# Altium footprint library Capacitors.PcbLib: 240 footprints (part 14 of 15)
Each footprint in its own frame and in the unit in brackets; x right, y up, seen from the top. Pads: shape width x height; smd on the part's side, far side on the other; paste and mask are expansions set on the pad; w line width, h text height; cw(c..) or ccw(c..) is an arc to the next point about the centre after c.
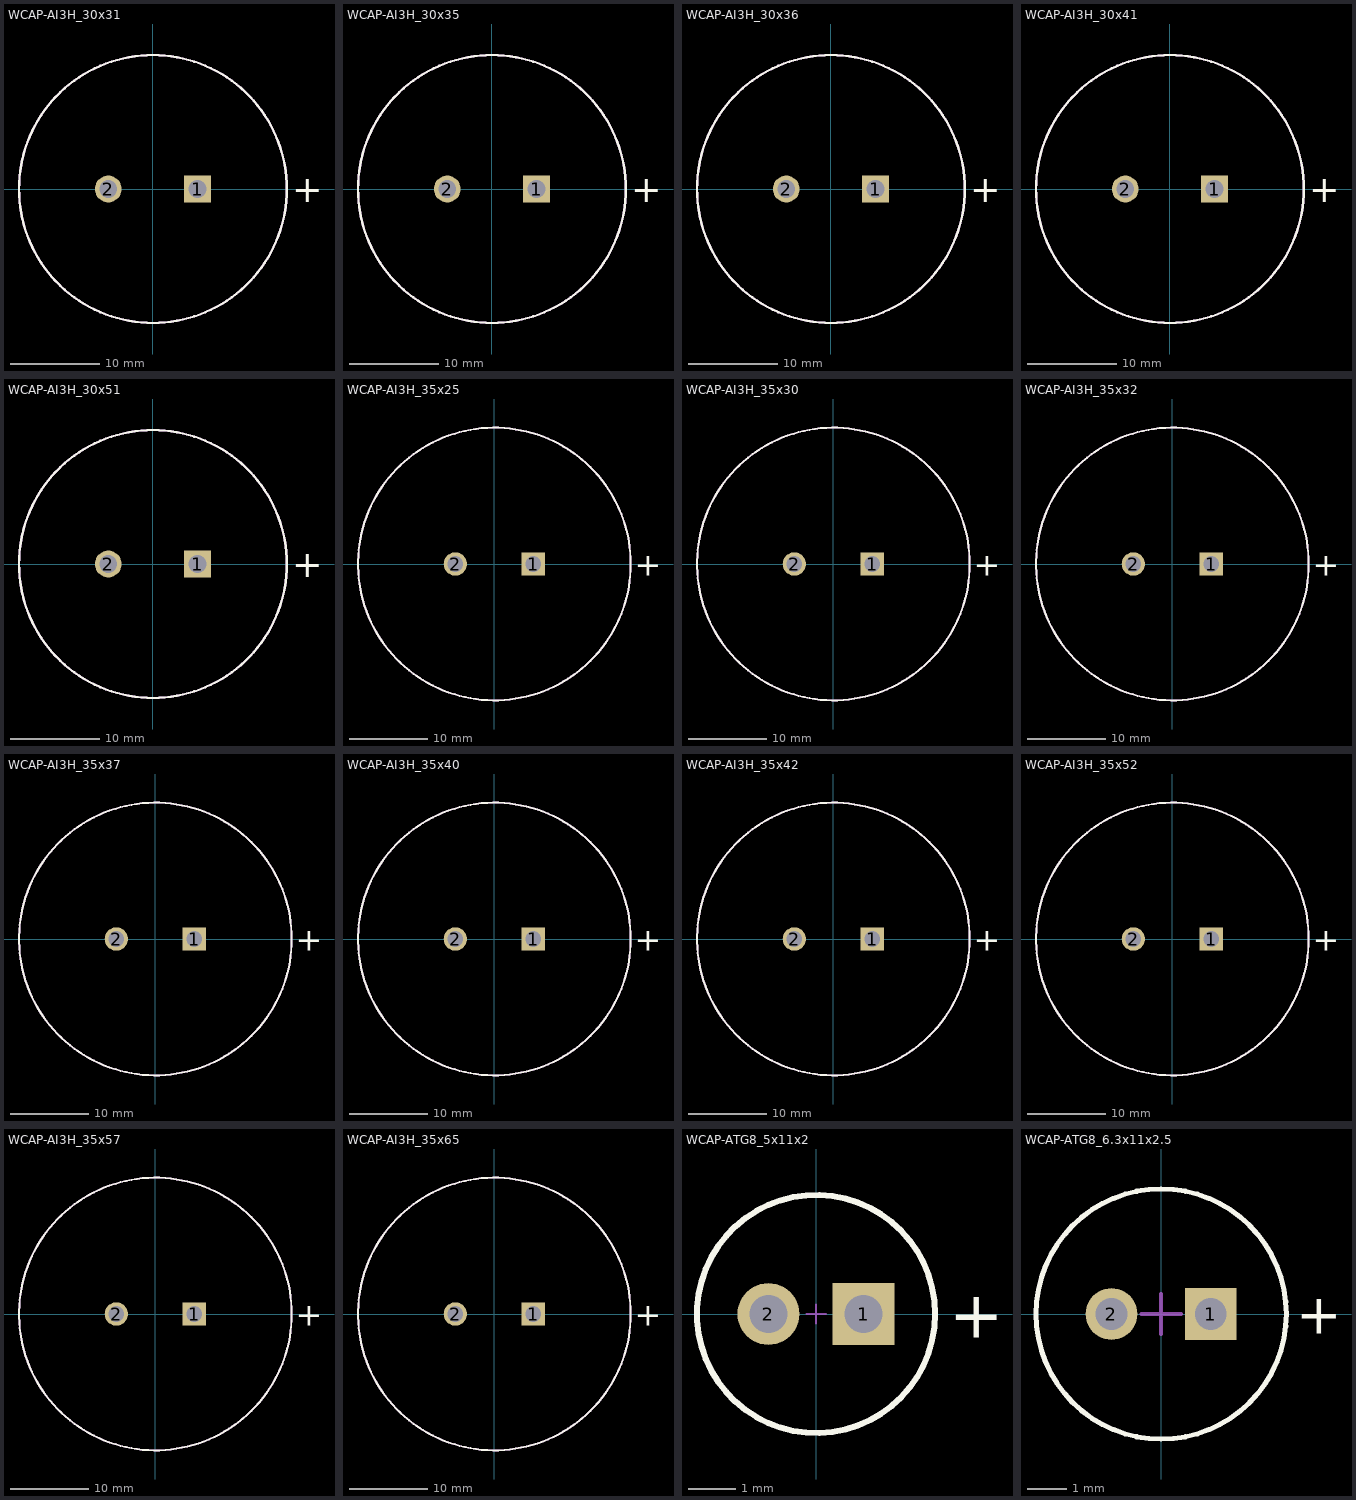
[diagram p13: the footprints below, top view; thin cyan lines are the x and y axes]

## WCAP-AI3H_30x31 [mm] "Aluminium Electrolytic Snap-In Capacitors, Ф30x31mm"
height 31
pads (2):
  rect 3x3 hole 2: 1(5,0)
  round 3 hole 2: 2(-5,0)
Top Overlay:
  circle w0.254: c0,0 r15
  text "+" at 15.6,-1.5 h3
Mechanical 13:
  circle w0.254: c0,0 r15
3D body "30x31.stp": height 31.09, standoff -6.05, extent -21.198,-21.163 21.104,21.139

## WCAP-AI3H_30x35 [mm] "Aluminium Electrolytic Snap-In Capacitors, Ф30x35mm"
height 35
pads (2):
  rect 3x3 hole 2: 1(5,0)
  round 3 hole 2: 2(-5,0)
Top Overlay:
  circle w0.254: c0,0 r15
  text "+" at 15.6,-1.5 h3
Mechanical 13:
  circle w0.254: c0,0 r15
3D body "30x35.stp": height 35.09, standoff -6.05, extent -21.211,-21.214 21.212,21.21

## WCAP-AI3H_30x36 [mm] "Aluminium Electrolytic Snap-In Capacitors, Ф30x36mm"
height 36
pads (2):
  rect 3x3 hole 2: 1(5,0)
  round 3 hole 2: 2(-5,0)
Top Overlay:
  circle w0.254: c0,0 r15
  text "+" at 15.6,-1.5 h3
Mechanical 13:
  circle w0.254: c0,0 r15
3D body "30x36.stp": height 36.09, standoff -6.05, extent -21.198,-21.163 21.104,21.139

## WCAP-AI3H_30x41 [mm] "Aluminium Electrolytic Snap-In Capacitors, Ф30x41mm"
height 41
pads (2):
  rect 3x3 hole 2: 1(5,0)
  round 3 hole 2: 2(-5,0)
Top Overlay:
  circle w0.254: c0,0 r15
  text "+" at 15.6,-1.5 h3
Mechanical 13:
  circle w0.254: c0,0 r15
3D body "30x41.stp": height 41.09, standoff -6.05, extent -21.198,-21.163 21.104,21.139

## WCAP-AI3H_30x51 [mm] "Aluminium Electrolytic Snap-In Capacitors, Ф30x51mm"
height 51
pads (2):
  rect 3x3 hole 2: 1(5,0)
  round 3 hole 2: 2(-5,0)
Top Overlay:
  circle w0.254: c0,0 r15
  text "+" at 15.6,-1.5 h3
Mechanical 13:
  circle w0.254: c0,0 r15
3D body "30x51.stp": height 51.09, standoff -6.05, extent -21.198,-21.163 21.104,21.139

## WCAP-AI3H_35x25 [mm] "Aluminium Electrolytic Snap-In Capacitors, Ф35x25mm"
height 25
pads (2):
  rect 3x3 hole 2: 1(5,0)
  round 3 hole 2: 2(-5,0)
Top Overlay:
  circle w0.254: c0,0 r17.5
  text "+" at 18,-1.5 h3
Mechanical 13:
  circle w0.254: c0,0 r17.5
3D body "35x25.stp": height 25.09, standoff -6.05, extent -24.749,-24.749 24.747,24.747

## WCAP-AI3H_35x30 [mm] "Aluminium Electrolytic Snap-In Capacitors, Ф35x30mm"
height 30
pads (2):
  rect 3x3 hole 2: 1(5,0)
  round 3 hole 2: 2(-5,0)
Top Overlay:
  circle w0.254: c0,0 r17.5
  text "+" at 18,-1.5 h3
Mechanical 13:
  circle w0.254: c0,0 r17.5
3D body "35x30.stp": height 30.09, standoff -6.05, extent -24.749,-24.749 24.747,24.747

## WCAP-AI3H_35x32 [mm] "Aluminium Electrolytic Snap-In Capacitors, Ф35x32mm"
height 32
pads (2):
  rect 3x3 hole 2: 1(5,0)
  round 3 hole 2: 2(-5,0)
Top Overlay:
  circle w0.254: c0,0 r17.5
  text "+" at 18,-1.5 h3
Mechanical 13:
  circle w0.254: c0,0 r17.5
3D body "35x32.stp": height 32.09, standoff -6.05, extent -24.731,-24.69 24.622,24.663

## WCAP-AI3H_35x37 [mm] "Aluminium Electrolytic Snap-In Capacitors, Ф35x37mm"
height 37
pads (2):
  rect 3x3 hole 2: 1(5,0)
  round 3 hole 2: 2(-5,0)
Top Overlay:
  circle w0.254: c0,0 r17.5
  text "+" at 18,-1.5 h3
Mechanical 13:
  circle w0.254: c0,0 r17.5
3D body "35x37.stp": height 37.09, standoff -6.05, extent -24.731,-24.69 24.622,24.663

## WCAP-AI3H_35x40 [mm] "Aluminium Electrolytic Snap-In Capacitors, Ф35x40mm"
height 40
pads (2):
  rect 3x3 hole 2: 1(5,0)
  round 3 hole 2: 2(-5,0)
Top Overlay:
  circle w0.254: c0,0 r17.5
  text "+" at 18,-1.5 h3
Mechanical 13:
  circle w0.254: c0,0 r17.5
3D body "35x40.stp": height 40.09, standoff -6.05, extent -24.748,-24.749 24.748,24.748

## WCAP-AI3H_35x42 [mm] "Aluminium Electrolytic Snap-In Capacitors, Ф35x42mm"
height 42
pads (2):
  rect 3x3 hole 2: 1(5,0)
  round 3 hole 2: 2(-5,0)
Top Overlay:
  circle w0.254: c0,0 r17.5
  text "+" at 18,-1.5 h3
Mechanical 13:
  circle w0.254: c0,0 r17.5
3D body "35x42.stp": height 42.09, standoff -6.05, extent -24.747,-24.749 24.747,24.745

## WCAP-AI3H_35x52 [mm] "Aluminium Electrolytic Snap-In Capacitors, Ф35x52mm"
height 52
pads (2):
  rect 3x3 hole 2: 1(5,0)
  round 3 hole 2: 2(-5,0)
Top Overlay:
  circle w0.254: c0,0 r17.5
  text "+" at 18,-1.5 h3
Mechanical 13:
  circle w0.254: c0,0 r17.5
3D body "35x52.stp": height 52.09, standoff -6.05, extent -24.731,-24.69 24.622,24.663

## WCAP-AI3H_35x57 [mm] "Aluminium Electrolytic Snap-In Capacitors, Ф35x57mm"
height 57
pads (2):
  rect 3x3 hole 2: 1(5,0)
  round 3 hole 2: 2(-5,0)
Top Overlay:
  circle w0.254: c0,0 r17.5
  text "+" at 18,-1.5 h3
Mechanical 13:
  circle w0.254: c0,0 r17.5
3D body "35x57.stp": height 57.09, standoff -6.05, extent -24.731,-24.69 24.622,24.663

## WCAP-AI3H_35x65 [mm] "Aluminium Electrolytic Snap-In Capacitors, Ф35x65mm"
height 65
pads (2):
  rect 3x3 hole 2: 1(5,0)
  round 3 hole 2: 2(-5,0)
Top Overlay:
  circle w0.254: c0,0 r17.5
  text "+" at 18,-1.5 h3
Mechanical 13:
  circle w0.254: c0,0 r17.5
3D body "35x65.stp": height 65.09, standoff -6.05, extent -24.746,-24.748 24.749,24.746

## WCAP-ATG8_5x11x2 [mm] "Aluminum Electrolytic Capacitors, 5x11mm"
height 11
pads (2):
  rect 1.3x1.3 hole 0.8: 1(1,0)
  round 1.3 hole 0.8: 2(-1,0)
Top Overlay:
  circle w0.127: c0,0 r2.5
  text "+" at 2.8,-0.5 h1
Mechanical 13:
  circle w0.1: c0,0 r2.5
Mechanical 15:
  lines w0.05: -0.2,0 0.2,0 ; 0,-0.2 0,0.2
3D body "5x11x2x0.5.stp": height 11.31, standoff -19.91, extent -2.49,-2.5 2.5,2.5

## WCAP-ATG8_6.3x11x2.5 [mm] "Aluminum Electrolytic Capacitors, 6.3x11mm"
height 11
pads (2):
  rect 1.3x1.3 hole 0.8: 1(1.25,0)
  round 1.3 hole 0.8: 2(-1.25,0)
Top Overlay:
  circle w0.127: c0,0 r3.15
  text "+" at 3.4,-0.5 h1
Mechanical 13:
  circle w0.1: c0,0 r3.15
Mechanical 15:
  lines w0.1: -0.5,0 0.5,0 ; 0,-0.5 0,0.5
3D body "6.3x11x2.5x0.5.stp": height 11.31, standoff -19.91, extent -3.14,-3.15 3.15,3.15